# Altium footprint library Resistors.PcbLib: 63 footprints (part 2 of 4)
Each footprint in its own frame and in the unit in brackets; x right, y up, seen from the top. Pads: shape width x height; smd on the part's side, far side on the other; paste and mask are expansions set on the pad; w line width, h text height; cw(c..) or ccw(c..) is an arc to the next point about the centre after c.
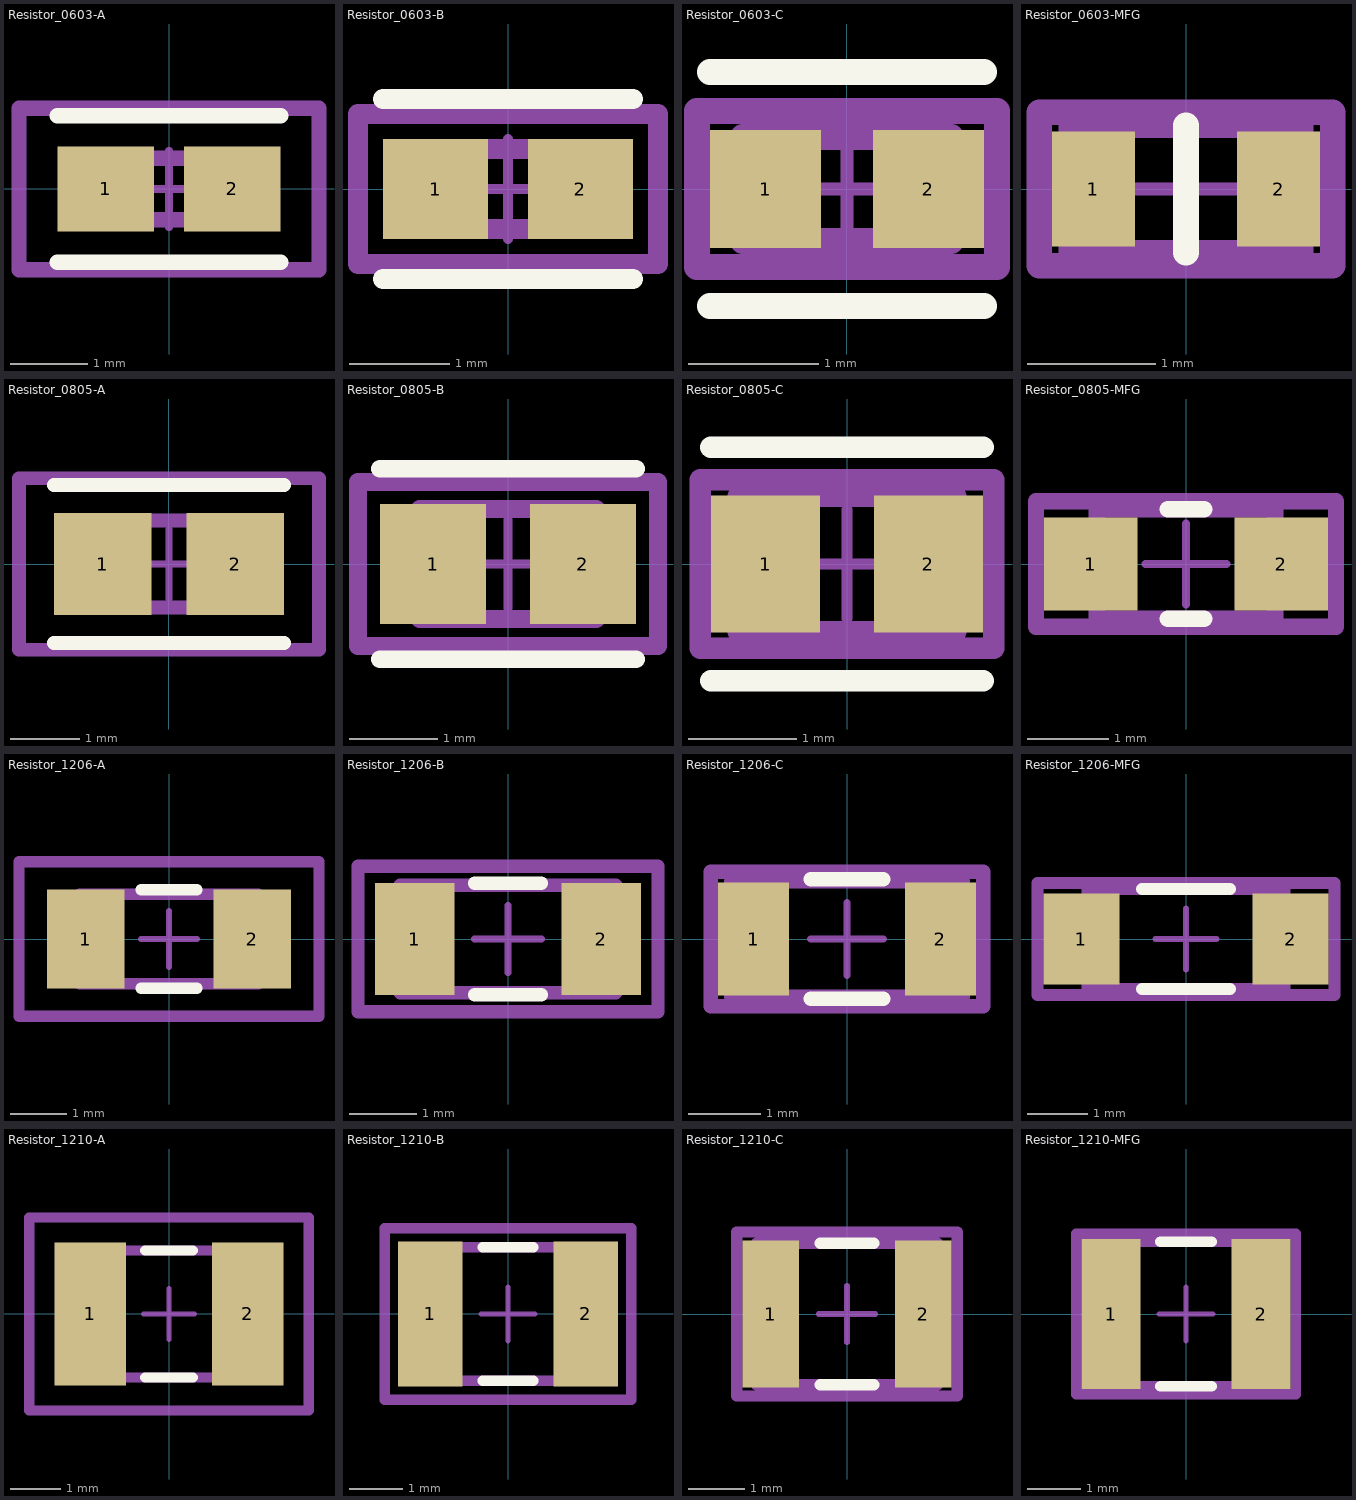
[diagram p1: the footprints below, top view; thin cyan lines are the x and y axes]

## Resistor_0603-A [mm]
pads (2):
  rect 1.255x1.106 smd paste+0 mask+0: 1(-0.826,0) 2(0.826,0)
Top Overlay:
  lines w0.2: -1.453,-0.953 1.453,-0.953 ; -1.453,0.953 1.453,0.953
Top Assembly:
  lines w0.2: -1.953,-1.053 -1.953,1.053 1.953,1.053 1.953,-1.053 -1.953,-1.053
Top 3D Body:
  lines w0.2: -0.8,-0.4 -0.8,0.4 0.8,0.4 0.8,-0.4 -0.8,-0.4
Top Courtyard:
  lines w0.2: -1.953,-1.053 -1.953,1.053 1.953,1.053 1.953,-1.053 -1.953,-1.053
Top Component Center:
  lines w0.1: -0.5,0 0.5,0 ; 0,-0.5 0,0.5
3D body "Res_Panasonic_Electronic_Components_ERA-3ARB202V_eec.STEP": height 0.25, standoff 0, extent -1.953,-1.053 1.953,1.053

## Resistor_0603-B [mm]
pads (2):
  rect 1.055x1.006 smd paste+0 mask+0: 1(-0.726,0) 2(0.726,0)
Top Overlay:
  lines w0.2: -1.253,-0.903 1.253,-0.903 ; -1.253,0.903 1.253,0.903
Top Assembly:
  lines w0.2: -1.503,-0.753 1.503,-0.753 1.503,0.753 -1.503,0.753 -1.503,-0.753
Top 3D Body:
  lines w0.2: -0.8,-0.4 0.8,-0.4 0.8,0.4 -0.8,0.4 -0.8,-0.4
Top Courtyard:
  lines w0.2: -1.503,-0.753 1.503,-0.753 1.503,0.753 -1.503,0.753 -1.503,-0.753
Top Component Center:
  lines w0.1: -0.5,0 0.5,0 ; 0,-0.5 0,0.5
3D body "Res_Panasonic_Electronic_Components_ERA-3ARB202V_eec.STEP": height 0.25, standoff 0, extent -1.503,-0.753 1.503,0.753

## Resistor_0603-C [mm]
pads (2):
  rect 0.855x0.906 smd paste+0 mask+0: 1(-0.626,0) 2(0.626,0)
Top Overlay:
  lines w0.2: -1.053,-0.9 1.053,-0.9 ; -1.053,0.9 1.053,0.9
Top Assembly:
  lines w0.2: -1.153,-0.6 -1.153,0.6 1.153,0.6 1.153,-0.6 -1.153,-0.6
Top 3D Body:
  lines w0.2: -0.8,-0.4 -0.8,0.4 0.8,0.4 0.8,-0.4 -0.8,-0.4
Top Courtyard:
  lines w0.2: -1.153,-0.6 -1.153,0.6 1.153,0.6 1.153,-0.6 -1.153,-0.6
Top Component Center:
  lines w0.1: -0.5,0 0.5,0 ; 0,-0.5 0,0.5
3D body "Res_Panasonic_Electronic_Components_ERA-3ARB202V_eec.STEP": height 0.25, standoff 0, extent -1.153,-0.6 1.153,0.6

## Resistor_0603-MFG [mm]
pads (2):
  rect 0.65x0.9 smd paste+0 mask+0: 1(-0.725,0) 2(0.725,0)
Top Overlay:
  lines w0.2: 0,-0.5 0,0.5
Top Assembly:
  lines w0.2: -1.15,-0.6 1.15,-0.6 1.15,0.6 -1.15,0.6 -1.15,-0.6
Top 3D Body:
  lines w0.2: -0.9,-0.5 0.9,-0.5 0.9,0.5 -0.9,0.5 -0.9,-0.5
Top Courtyard:
  lines w0.2: -1.15,-0.6 1.15,-0.6 1.15,0.6 -1.15,0.6 -1.15,-0.6
Top Component Center:
  lines w0.1: -0.5,0 0.5,0 ; 0,-0.5 0,0.5
3D body "Res_Panasonic_Electronic_Components_ERA-3ARB202V_eec.STEP": height 0.25, standoff 0, extent -1.15,-0.6 1.15,0.6

## Resistor_0805-A [mm]
pads (2):
  rect 1.405x1.462 smd paste+0 mask+0: 1(-0.951,0) 2(0.951,0)
Top Overlay:
  lines w0.2: -1.653,-1.131 1.653,-1.131 ; -1.653,1.131 1.653,1.131
Top Assembly:
  lines w0.2: -2.153,-1.231 -2.153,1.231 2.153,1.231 2.153,-1.231 -2.153,-1.231
Top 3D Body:
  lines w0.2: -1,-0.625 -1,0.625 1,0.625 1,-0.625 -1,-0.625
Top Courtyard:
  lines w0.2: -2.153,-1.231 -2.153,1.231 2.153,1.231 2.153,-1.231 -2.153,-1.231
Top Component Center:
  lines w0.1: -0.5,0 0.5,0 ; 0,-0.5 0,0.5
3D body "Res_Panasonic_ERA6AEB203V_eec.STEP": height 0.25, standoff 0, extent -2.153,-1.231 2.153,1.231

## Resistor_0805-B [mm]
pads (2):
  rect 1.205x1.362 smd paste+0 mask+0: 1(-0.851,0) 2(0.851,0)
Top Overlay:
  lines w0.2: -1.453,-1.081 1.453,-1.081 ; -1.453,1.081 1.453,1.081
Top Assembly:
  lines w0.2: -1.703,-0.931 -1.703,0.931 1.703,0.931 1.703,-0.931 -1.703,-0.931
Top 3D Body:
  lines w0.2: -1,-0.625 -1,0.625 1,0.625 1,-0.625 -1,-0.625
Top Courtyard:
  lines w0.2: -1.703,-0.931 -1.703,0.931 1.703,0.931 1.703,-0.931 -1.703,-0.931
Top Component Center:
  lines w0.1: -0.5,0 0.5,0 ; 0,-0.5 0,0.5
3D body "Res_Panasonic_ERA6AEB203V_eec.STEP": height 0.25, standoff 0, extent -1.703,-0.931 1.703,0.931

## Resistor_0805-C [mm]
pads (2):
  rect 1.005x1.262 smd paste+0 mask+0: 1(-0.751,0) 2(0.751,0)
Top Overlay:
  lines w0.2: -1.253,-1.075 1.253,-1.075 ; -1.253,1.075 1.253,1.075
Top Assembly:
  lines w0.2: -1.353,-0.775 -1.353,0.775 1.353,0.775 1.353,-0.775 -1.353,-0.775
Top 3D Body:
  lines w0.2: -1,-0.625 -1,0.625 1,0.625 1,-0.625 -1,-0.625
Top Courtyard:
  lines w0.2: -1.353,-0.775 -1.353,0.775 1.353,0.775 1.353,-0.775 -1.353,-0.775
Top Component Center:
  lines w0.1: -0.5,0 0.5,0 ; 0,-0.5 0,0.5
3D body "Res_Panasonic_ERA6AEB203V_eec.STEP": height 0.25, standoff 0, extent -1.353,-0.775 1.353,0.775

## Resistor_0805-MFG [mm]
pads (2):
  rect 1.15x1.15 smd paste+0 mask+0: 1(-1.175,0) 2(1.175,0)
Top Overlay:
  lines w0.2: -0.225,-0.675 0.225,-0.675 ; -0.225,0.675 0.225,0.675
Top Assembly:
  lines w0.2: -1.85,-0.775 1.85,-0.775 1.85,0.775 -1.85,0.775 -1.85,-0.775
Top 3D Body:
  lines w0.2: -1.1,-0.675 1.1,-0.675 1.1,0.675 -1.1,0.675 -1.1,-0.675
Top Courtyard:
  lines w0.2: -1.85,-0.775 1.85,-0.775 1.85,0.775 -1.85,0.775 -1.85,-0.775
Top Component Center:
  lines w0.1: -0.5,0 0.5,0 ; 0,-0.5 0,0.5
3D body "Res_Panasonic_ERA6AEB203V_eec.STEP": height 0.25, standoff 0, extent -1.85,-0.775 1.85,0.775

## Resistor_1206-A [mm]
pads (2):
  rect 1.382x1.762 smd paste+0 mask+0: 1(-1.489,0) 2(1.489,0)
Top Overlay:
  lines w0.2: -0.498,-0.881 0.498,-0.881 ; -0.498,0.881 0.498,0.881
Top Assembly:
  lines w0.2: -2.68,-1.381 -2.68,1.381 2.68,1.381 2.68,-1.381 -2.68,-1.381
Top 3D Body:
  lines w0.2: -1.6,-0.8 -1.6,0.8 1.6,0.8 1.6,-0.8 -1.6,-0.8
Top Courtyard:
  lines w0.2: -2.68,-1.381 -2.68,1.381 2.68,1.381 2.68,-1.381 -2.68,-1.381
Top Component Center:
  lines w0.1: -0.5,0 0.5,0 ; 0,-0.5 0,0.5
3D body "Res_Panasonic_Electronic_Components_ERJ-8ENF37R4V_eec.STEP": height 0.25, standoff 0, extent -2.68,-1.381 2.68,1.381

## Resistor_1206-B [mm]
pads (2):
  rect 1.182x1.662 smd paste+0 mask+0: 1(-1.389,0) 2(1.389,0)
Top Overlay:
  lines w0.2: -0.498,-0.831 0.498,-0.831 ; -0.498,0.831 0.498,0.831
Top Assembly:
  lines w0.2: -2.23,-1.081 -2.23,1.081 2.23,1.081 2.23,-1.081 -2.23,-1.081
Top 3D Body:
  lines w0.2: -1.6,-0.8 -1.6,0.8 1.6,0.8 1.6,-0.8 -1.6,-0.8
Top Courtyard:
  lines w0.2: -2.23,-1.081 -2.23,1.081 2.23,1.081 2.23,-1.081 -2.23,-1.081
Top Component Center:
  lines w0.1: -0.5,0 0.5,0 ; 0,-0.5 0,0.5
3D body "Res_Panasonic_Electronic_Components_ERJ-8ENF37R4V_eec.STEP": height 0.25, standoff 0, extent -2.23,-1.081 2.23,1.081

## Resistor_1206-C [mil]
pads (2):
  rect 38.66x61.5 smd paste+0 mask+0: 1(-50.75,0) 2(50.75,0)
Top Overlay:
  lines w7.87: -19.61,-32.48 19.61,-32.48 ; -19.61,32.48 19.61,32.48
Top Assembly:
  lines w7.87: -74.01,-36.42 74.01,-36.42 74.01,36.42 -74.01,36.42 -74.01,-36.42
Top 3D Body:
  lines w7.87: -62.99,-31.5 62.99,-31.5 62.99,31.5 -62.99,31.5 -62.99,-31.5
Top Courtyard:
  lines w7.87: -74.01,-36.42 74.01,-36.42 74.01,36.42 -74.01,36.42 -74.01,-36.42
Top Component Center:
  lines w3.94: -19.68,0 19.68,0 ; 0,-19.68 0,19.68
3D body "Res_Panasonic_Electronic_Components_ERJ-8ENF37R4V_eec.STEP": height 10, standoff 0, extent -74.01,-36.42 74.01,36.42

## Resistor_1206-MFG [mm]
pads (2):
  rect 1.25x1.5 smd paste+0 mask+0: 1(-1.725,0) 2(1.725,0)
Top Overlay:
  lines w0.2: -0.725,-0.825 0.725,-0.825 ; -0.725,0.825 0.725,0.825
Top Assembly:
  lines w0.2: -2.45,-0.925 -2.45,0.925 2.45,0.925 2.45,-0.925 -2.45,-0.925
Top 3D Body:
  lines w0.2: -1.625,-0.825 -1.625,0.825 1.625,0.825 1.625,-0.825 -1.625,-0.825
Top Courtyard:
  lines w0.2: -2.45,-0.925 -2.45,0.925 2.45,0.925 2.45,-0.925 -2.45,-0.925
Top Component Center:
  lines w0.1: -0.5,0 0.5,0 ; 0,-0.5 0,0.5
3D body "Res_Panasonic_ERJ8ENF20R0V_eec.STEP": height 0.25, standoff 0, extent -2.45,-0.925 2.45,0.925

## Resistor_1210-A [mm]
pads (2):
  rect 1.405x2.806 smd paste+0 mask+0: 1(-1.551,0) 2(1.551,0)
Top Overlay:
  lines w0.2: -0.473,-1.25 0.473,-1.25 ; -0.473,1.25 0.473,1.25
Top Assembly:
  lines w0.2: -2.753,-1.903 -2.753,1.903 2.753,1.903 2.753,-1.903 -2.753,-1.903
Top 3D Body:
  lines w0.2: -1.6,-1.25 -1.6,1.25 1.6,1.25 1.6,-1.25 -1.6,-1.25
Top Courtyard:
  lines w0.2: -2.753,-1.903 -2.753,1.903 2.753,1.903 2.753,-1.903 -2.753,-1.903
Top Component Center:
  lines w0.1: -0.5,0 0.5,0 ; 0,-0.5 0,0.5
3D body "Res_Vishay_CRCW12104K70FKEC_eec.STEP": height 0.25, standoff 0, extent -2.753,-1.903 2.753,1.903

## Resistor_1210-B [mm]
pads (2):
  rect 1.205x2.706 smd paste+0 mask+0: 1(-1.451,0) 2(1.451,0)
Top Overlay:
  lines w0.2: -0.473,-1.25 0.473,-1.25 ; -0.473,1.25 0.473,1.25
Top Assembly:
  lines w0.2: -2.303,-1.603 -2.303,1.603 2.303,1.603 2.303,-1.603 -2.303,-1.603
Top 3D Body:
  lines w0.2: -1.6,-1.25 -1.6,1.25 1.6,1.25 1.6,-1.25 -1.6,-1.25
Top Courtyard:
  lines w0.2: -2.303,-1.603 -2.303,1.603 2.303,1.603 2.303,-1.603 -2.303,-1.603
Top Component Center:
  lines w0.1: -0.5,0 0.5,0 ; 0,-0.5 0,0.5
3D body "Res_Vishay_CRCW12104K70FKEC_eec.STEP": height 0.25, standoff 0, extent -2.303,-1.603 2.303,1.603

## Resistor_1210-C [mm]
pads (2):
  rect 1.005x2.606 smd paste+0 mask+0: 1(-1.351,0) 2(1.351,0)
Top Overlay:
  lines w0.2: -0.473,-1.25 0.473,-1.25 ; -0.473,1.25 0.473,1.25
Top Assembly:
  lines w0.2: -1.953,-1.45 -1.953,1.45 1.953,1.45 1.953,-1.45 -1.953,-1.45
Top 3D Body:
  lines w0.2: -1.6,-1.25 -1.6,1.25 1.6,1.25 1.6,-1.25 -1.6,-1.25
Top Courtyard:
  lines w0.2: -1.953,-1.45 -1.953,1.45 1.953,1.45 1.953,-1.45 -1.953,-1.45
Top Component Center:
  lines w0.1: -0.5,0 0.5,0 ; 0,-0.5 0,0.5
3D body "Res_Vishay_CRCW12104K70FKEC_eec.STEP": height 0.25, standoff 0, extent -1.953,-1.45 1.953,1.45

## Resistor_1210-MFG [mm]
pads (2):
  rect 1.1x2.8 smd paste+0 mask+0: 1(-1.4,0) 2(1.4,0)
Top Overlay:
  lines w0.2: -0.475,-1.35 0.475,-1.35 ; -0.475,1.35 0.475,1.35
Top Assembly:
  lines w0.2: -2.05,-1.5 2.05,-1.5 2.05,1.5 -2.05,1.5 -2.05,-1.5
Top 3D Body:
  lines w0.2: -1.7,-1.35 1.7,-1.35 1.7,1.35 -1.7,1.35 -1.7,-1.35
Top Courtyard:
  lines w0.2: -2.05,-1.5 2.05,-1.5 2.05,1.5 -2.05,1.5 -2.05,-1.5
Top Component Center:
  lines w0.1: -0.5,0 0.5,0 ; 0,-0.5 0,0.5
3D body "Res_Vishay_CRCW12104K70FKEC_eec.STEP": height 0.25, standoff 0, extent -2.05,-1.5 2.05,1.5